# Altium footprint library RODION.PcbLib: 131 footprints (part 7 of 9)
Each footprint in its own frame and in the unit in brackets; x right, y up, seen from the top. Pads: shape width x height; smd on the part's side, far side on the other; paste and mask are expansions set on the pad; w line width, h text height; cw(c..) or ccw(c..) is an arc to the next point about the centre after c.
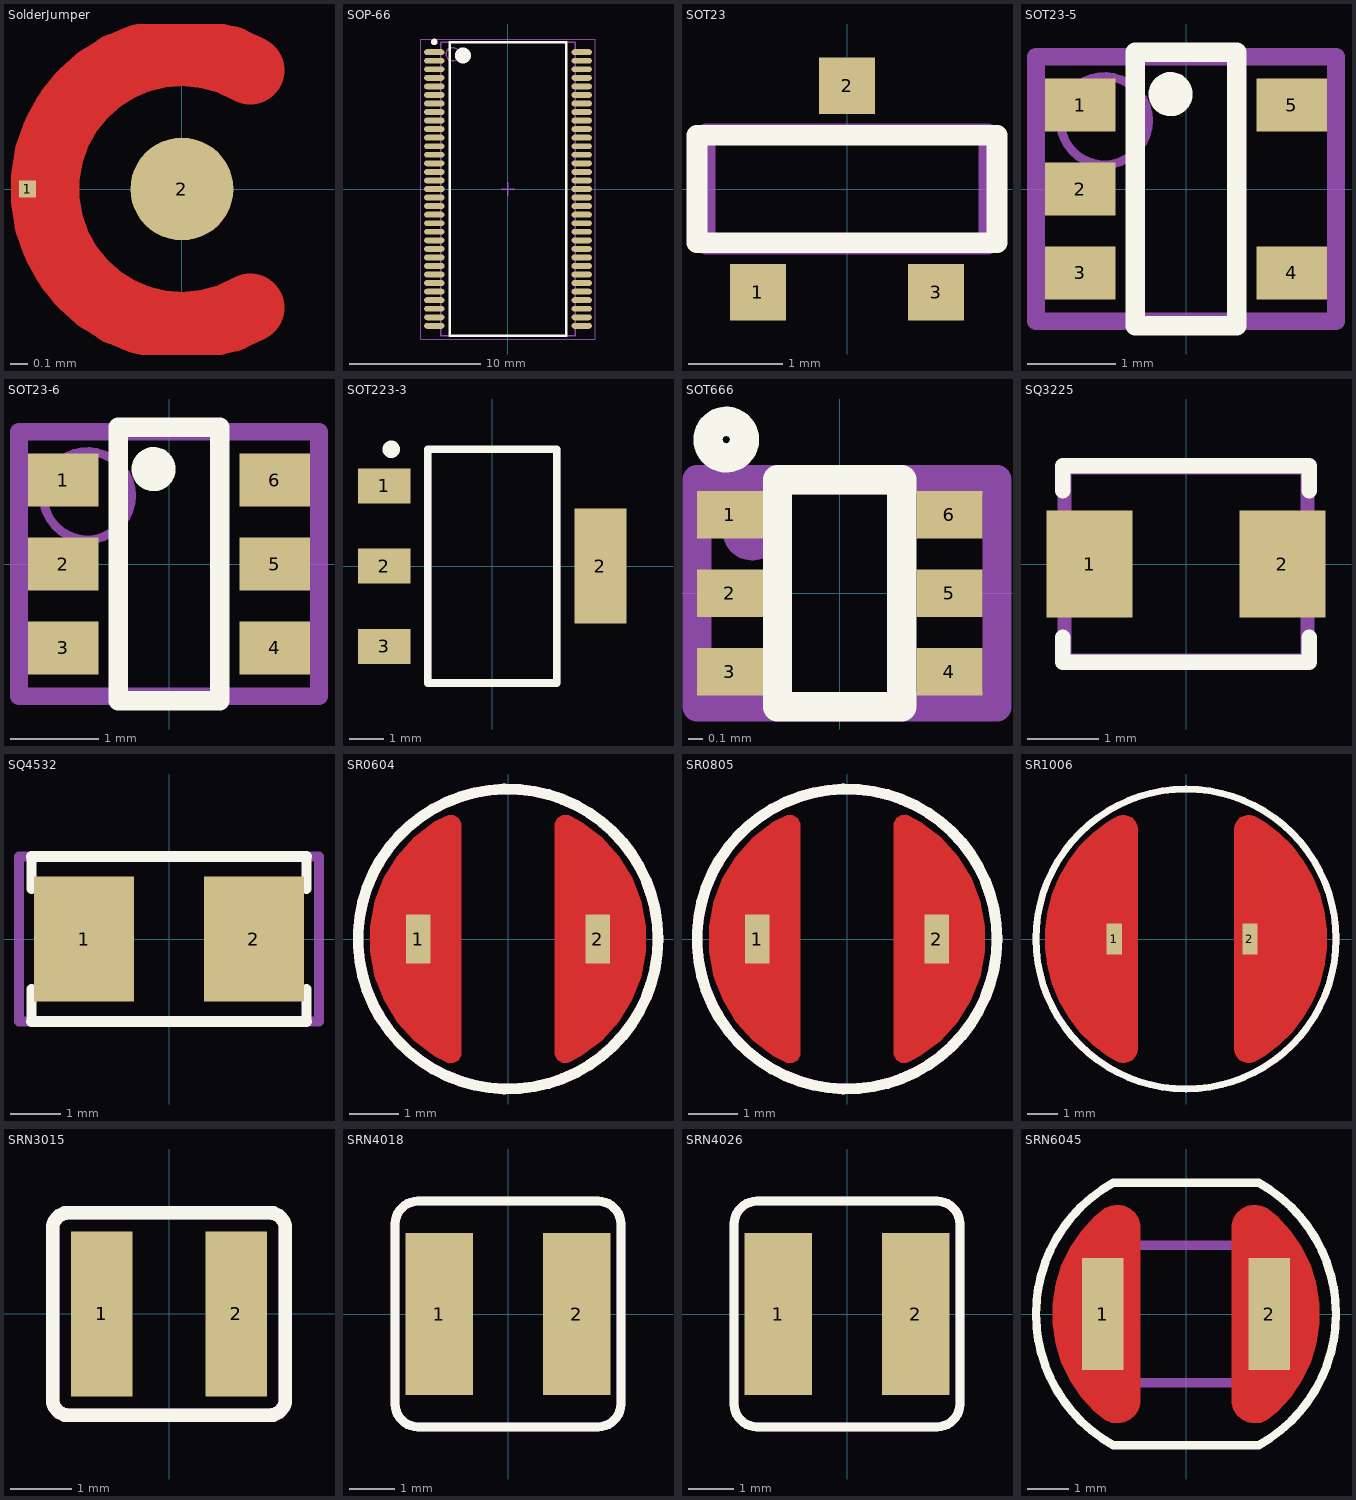
[diagram p6: the footprints below, top view; thin cyan lines are the x and y axes]

## SolderJumper [mm] "Digital"
pads (2):
  rect 0.1x0.1 smd mask+0.05: 1(-0.9,0)
  round 0.6 smd mask+0.2: 2(0,0)
Top Layer:
  lines w0.4: 0.4,-0.693 cw(c0,0) 0.4,0.693
Top_Assy:
  text ".Designator" at -0.6,-0.2 h1

## SOP-66 [mm] "SOP, 66-Leads, Body 22.22x10.16mm, Pitch 0.65mm, , IPC Medium Density"
height 1.2
pads (66):
  oval 1.55x0.45 smd: 1(-5.6,10.4) 2(-5.6,9.75) 3(-5.6,9.1) 4(-5.6,8.45) 5(-5.6,7.8) 6(-5.6,7.15) 7(-5.6,6.5) 8(-5.6,5.85) 9(-5.6,5.2) 10(-5.6,4.55) 11(-5.6,3.9) 12(-5.6,3.25) 13(-5.6,2.6) 14(-5.6,1.95) 15(-5.6,1.3) 16(-5.6,0.65) 17(-5.6,0) 18(-5.6,-0.65) 19(-5.6,-1.3) 20(-5.6,-1.95) 21(-5.6,-2.6) 22(-5.6,-3.25) 23(-5.6,-3.9) 24(-5.6,-4.55) 25(-5.6,-5.2) 26(-5.6,-5.85) 27(-5.6,-6.5) 28(-5.6,-7.15) 29(-5.6,-7.8) 30(-5.6,-8.45) 31(-5.6,-9.1) 32(-5.6,-9.75) 33(-5.6,-10.4) 34(5.6,-10.4) 35(5.6,-9.75) 36(5.6,-9.1) 37(5.6,-8.45) 38(5.6,-7.8) 39(5.6,-7.15) 40(5.6,-6.5) 41(5.6,-5.85) 42(5.6,-5.2) 43(5.6,-4.55) 44(5.6,-3.9) 45(5.6,-3.25) 46(5.6,-2.6) 47(5.6,-1.95) 48(5.6,-1.3) 49(5.6,-0.65) 50(5.6,0) 51(5.6,0.65) 52(5.6,1.3) 53(5.6,1.95) 54(5.6,2.6) 55(5.6,3.25) 56(5.6,3.9) 57(5.6,4.55) 58(5.6,5.2) 59(5.6,5.85) 60(5.6,6.5) 61(5.6,7.15) 62(5.6,7.8) 63(5.6,8.45) 64(5.6,9.1) 65(5.6,9.75) 66(5.6,10.4)
Top Overlay:
  circle w0.6: c-3.425,10.15 r0.3
  circle w0.25: c-5.6,11.175 r0.125
  lines w0.2: -4.425,-11.15 4.425,-11.15 4.425,11.15 -4.425,11.15 -4.425,-11.15
Top_Assy:
  circle w0.1: c-4.2,10.25 r0.5
  lines w0.1: -5.1,-11.15 5.1,-11.15 5.1,11.15 -5.1,11.15 -5.1,-11.15
Mechanical 15:
  lines w0.05: -6.625,-11.4 6.625,-11.4 6.625,11.4 -6.625,11.4 -6.625,-11.4
  lines w0.1: -0.5,0 0.5,0 ; 0,-0.5 0,0.5
3D body "TSOP 2-66.step": height 1.2, standoff 0, extent -5.88,-11.11 5.88,11.11

## SOT23 [mm] "SOT23, 3-Leads, Body 2.9x1.3mm, Pitch 0.95mm, Lead Span 2.3mm - Reverse Pinning, IPC Medium Density"
height 1.1
pads (3):
  rect 0.6x0.6 smd: 1(-0.95,-1.1) 2(0,1.1) 3(0.95,-1.1)
Top Overlay:
  lines w0.22: -1.6,-0.575 -1.6,0.575 1.6,0.575 1.6,-0.575 -1.6,-0.575
Top_Assy:
  lines w0.2: -1.5,-0.6 1.5,-0.6 1.5,0.6 -1.5,0.6 -1.5,-0.6
  text ".Designator" at -1.85,-0.25 h1
3D body "SW3dPS-3-lead sot23-3.STEP": height 1.01, standoff -0.01, extent -1.46,-1.25 1.46,1.226

## SOT23-5 [mm] "SOT23, 5-Leads, Body 2.9x1.6mm, Pitch 0.95mm, Lead Span 2.7mm, IPC Medium Density"
height 1.45
pads (5):
  rect 0.8x0.6 smd: 1(-1.2,0.95) 2(-1.2,0) 3(-1.2,-0.95) 4(1.2,-0.95) 5(1.2,0.95)
Top Overlay:
  circle w0.25: c-0.175,1.075 r0.125
  lines w0.22: -0.575,-1.55 0.575,-1.55 0.575,1.55 -0.575,1.55 -0.575,-1.55
Top_Assy:
  circle w0.1: c-0.925,0.775 r0.5
  lines w0.2: -1.7,-1.5 -1.7,1.5 1.7,1.5 1.7,-1.5 -1.7,-1.5
  text ".Designator" at -1.3,-1.075 h1
3D body "User Library-SOT23-5-2.step": height 1.45, standoff 0, extent -1.4,-1.45 1.4,1.45

## SOT23-6 [mm] "SOT23, 6-Leads, Body 2.9x1.6mm, Pitch 0.95mm, Lead Span 2.7mm, IPC Medium Density"
height 1.45
pads (6):
  rect 0.8x0.6 smd: 1(-1.2,0.95) 2(-1.2,0) 3(-1.2,-0.95) 4(1.2,-0.95) 5(1.2,0) 6(1.2,0.95)
Top Overlay:
  circle w0.25: c-0.175,1.075 r0.125
  lines w0.22: -0.575,-1.55 0.575,-1.55 0.575,1.55 -0.575,1.55 -0.575,-1.55
Top_Assy:
  circle w0.1: c-0.925,0.775 r0.5
  lines w0.2: -1.7,-1.5 -1.7,1.5 1.7,1.5 1.7,-1.5 -1.7,-1.5
  text ".Designator" at -1.3,-1.075 h1
3D body "User Library-SOT23-6-2.STEP": height 1.45, standoff 0, extent -1.4,-1.45 1.4,1.45

## SOT223-3 [mm] "SOT223, 4-Leads, Body 6.5x3.5mm, Pitch 2.3mm, Lead Span 7mm, IPC Medium Density"
height 1.7
pads (4):
  rect 1.5x1 smd: 1(-3.1,2.3) 2(-3.1,0) 3(-3.1,-2.3)
  rect 1.5x3.3 smd: 2(3.1,0)
Top Overlay:
  circle w0.25: c-2.9,3.35 r0.125
  lines w0.22: -1.85,-3.35 1.85,-3.35 1.85,3.35 -1.85,3.35 -1.85,-3.35
Top_Assy:
  lines w0.2: -1.85,-3.35 1.85,-3.35 1.85,3.35 -1.85,3.35 -1.85,-3.35
  text ".Designator" at -1.675,0.025 h1
3D body "SOT223-3.STEP": height 1.7, standoff 0, extent -3.5,-3.25 3.5,3.25

## SOT666 [mm] "SOT666, 6-Leads, Body 1.6x1.6mm, Pitch 0.5mm"
height 0.55
pads (6):
  rect 0.45x0.325 smd: 1(-0.75,0.537) 2(-0.75,0) 3(-0.75,-0.537) 4(0.75,-0.537) 5(0.75,0) 6(0.75,0.537)
Top Overlay:
  circle w0.2: c-0.775,1.05 r0.125
  lines w0.2: -0.425,-0.775 0.425,-0.775 0.425,0.775 -0.425,0.775 -0.425,-0.775
Top_Assy:
  circle w0.2: c-0.6,0.425 r0.1
  lines w0.2: -0.975,-0.775 -0.975,0.775 1.075,0.775 1.075,-0.775 -0.975,-0.775
  text ".Designator" at -0.55,-0.5 h1
3D body "SOT666.step": height 0.6, standoff 0, extent -0.8,-0.795 0.8,0.795

## SQ3225 [mm] "Chip Inductor, Body o7.5mm"
height 4
pads (2):
  rect 1.2x1.5 smd: 1(-1.35,0) 2(1.35,0)
Top Overlay:
  lines w0.22: -1.725,-1.375 -1.725,-1.025 ; -1.725,1.025 -1.725,1.375 1.7,1.375 ; -1.7,-1.375 1.725,-1.375 1.725,-1.025 ; 1.725,1.025 1.725,1.375
Top_Assy:
  lines w0.2: -1.7,-1.35 -1.7,1.35 1.7,1.35 1.7,-1.35 -1.7,-1.35
  text ".Designator" at -1.825,-0.125 h1
3D body "SQ3225.STEP": height 2, standoff 0, extent -1.6,-1.25 1.6,1.25

## SQ4532 [mm] "Chip Inductor, Body o3.2mm"
height 2.6
pads (2):
  rect 2x2.5 smd: 1(-1.7,0) 2(1.7,0)
Top Overlay:
  lines w0.2: -2.75,-1.65 -2.75,-1 ; -2.75,1 -2.75,1.65 ; 2.75,-1.65 2.75,-1 ; 2.75,1 2.75,1.65
  lines w0.22: -2.75,-1.65 2.75,-1.65 ; -2.75,1.65 2.75,1.65
Top_Assy:
  lines w0.2: -3,-1.65 -3,1.65 3,1.65 3,-1.65 -3,-1.65
  text ".Designator" at -2.025,0.2 h1
3D body "SQ4532.STEP": height 2.6, standoff 0, extent -2.3,-1.6 2.3,1.6

## SR0604 [mm] "Chip Inductor, Body o5.6mm"
height 4.5
pads (2):
  rect 0.5x1 smd: 1(-1.825,0) 2(1.825,0)
Top Layer:
  region: 0.948,2.297 0.948,-2.301 0.948,-2.357 1.004,-2.456 1.1,-2.515 1.213,-2.52 1.263,-2.495 1.493,-2.379 1.903,-2.067 2.249,-1.685 2.519,-1.246 2.705,-0.766 2.8,-0.26 2.801,0.255 2.708,0.762 2.523,1.243 2.254,1.682 1.91,2.065 1.501,2.379 1.271,2.495 1.219,2.521 1.104,2.517 1.005,2.456 0.948,2.355
  region: -0.949,-2.307 -0.949,2.302 -0.949,2.358 -1.005,2.457 -1.101,2.516 -1.214,2.521 -1.264,2.495 -1.495,2.379 -1.905,2.066 -2.252,1.684 -2.522,1.244 -2.707,0.763 -2.802,0.255 -2.801,-0.261 -2.707,-0.768 -2.521,-1.25 -2.25,-1.689 -1.903,-2.071 -1.492,-2.384 -1.262,-2.5 -1.212,-2.525 -1.1,-2.52 -1.004,-2.461 -0.949,-2.363
Top Overlay:
  circle w0.22: c0,0 r3.05
Top_Assy:
  circle w0.22: c0,0 r3.05
  text ".Designator" at -2.5,-0.225 h1
3D body "User Library-SR0604Cu.step": height 4.5, standoff 0, extent -2.764,-2.8 2.764,2.8

## SR0805 [mm] "Chip Inductor, Body o5.6mm"
height 4.5
pads (2):
  rect 0.5x1 smd: 1(-1.825,0) 2(1.825,0)
Top Layer:
  region: 0.948,2.297 0.948,-2.301 0.948,-2.357 1.004,-2.456 1.1,-2.515 1.213,-2.52 1.263,-2.495 1.493,-2.379 1.903,-2.067 2.249,-1.685 2.519,-1.246 2.705,-0.766 2.8,-0.26 2.801,0.255 2.708,0.762 2.523,1.243 2.254,1.682 1.91,2.065 1.501,2.379 1.271,2.495 1.219,2.521 1.104,2.517 1.005,2.456 0.948,2.355
  region: -0.949,-2.307 -0.949,2.302 -0.949,2.358 -1.005,2.457 -1.101,2.516 -1.214,2.521 -1.264,2.495 -1.495,2.379 -1.905,2.066 -2.252,1.684 -2.522,1.244 -2.707,0.763 -2.802,0.255 -2.801,-0.261 -2.707,-0.768 -2.521,-1.25 -2.25,-1.689 -1.903,-2.071 -1.492,-2.384 -1.262,-2.5 -1.212,-2.525 -1.1,-2.52 -1.004,-2.461 -0.949,-2.363
Top Overlay:
  circle w0.22: c0,0 r3.05
Top_Assy:
  circle w0.22: c0,0 r3.05
  text ".Designator" at -3,-0.15 h1
3D body "User Library-SR0604Cu.step": height 4.5, standoff 0, extent -2.764,-2.8 2.764,2.8

## SR1006 [mm] "Chip Inductor, Body o9.5mm"
height 5.5
pads (2):
  rect 0.5x1 smd: 1(-2.339,0) 2(2.088,0)
Top Layer:
  region: -2.297,-3.985 -2.559,-3.835 -3.038,-3.468 -3.464,-3.041 -3.832,-2.563 -4.134,-2.04 -4.365,-1.483 -4.521,-0.9 -4.6,-0.302 -4.6,0.302 -4.521,0.9 -4.365,1.483 -4.134,2.04 -3.832,2.563 -3.464,3.041 -3.038,3.468 -2.559,3.835 -2.297,3.985 -2.242,4.017 -2.119,4.05 -1.992,4.05 -1.87,4.017 -1.76,3.953 -1.67,3.863 -1.606,3.753 -1.573,3.631 -1.573,3.567 -1.573,-3.567 -1.573,-3.631 -1.606,-3.753 -1.67,-3.863 -1.76,-3.953 -1.87,-4.017 -1.992,-4.05 -2.119,-4.05 -2.242,-4.017
  region: 2.297,-3.985 2.559,-3.835 3.038,-3.468 3.464,-3.041 3.832,-2.563 4.134,-2.04 4.365,-1.483 4.521,-0.9 4.6,-0.302 4.6,0.302 4.521,0.9 4.365,1.483 4.134,2.04 3.832,2.563 3.464,3.041 3.038,3.468 2.559,3.835 2.297,3.985 2.242,4.017 2.119,4.05 1.992,4.05 1.87,4.017 1.76,3.953 1.67,3.863 1.606,3.753 1.573,3.631 1.573,3.567 1.573,-3.567 1.573,-3.631 1.606,-3.753 1.67,-3.863 1.76,-3.953 1.87,-4.017 1.992,-4.05 2.119,-4.05 2.242,-4.017
Top Overlay:
  circle w0.22: c0,0 r4.9
Top_Assy:
  circle w0.22: c0,0 r4.9
  text ".Designator" at -2.425,-0.1 h1
3D body "SR1006.step": height 5.51, standoff 0, extent -4.75,-4.75 4.75,4.75

## SRN3015 [mm] "Chip Inductor, Body 3mm"
height 1.5
pads (2):
  rect 1x2.7 smd: 1(-1.1,0) 2(1.1,0)
Top Overlay:
  lines w0.22: -1.7,-1.65 1.7,-1.65 ; -1.7,1.65 1.7,1.65 ; -1.65,-1.65 cw(c-1.65,-1.4) -1.9,-1.4 -1.9,1.4 cw(c-1.65,1.4) -1.65,1.65 ; 1.65,-1.65 ccw(c1.65,-1.4) 1.9,-1.4 1.9,1.4 ccw(c1.65,1.4) 1.65,1.65
Top_Assy:
  lines w0.22: -1.7,-1.65 1.7,-1.65 ; -1.7,1.65 1.7,1.65 ; -1.65,-1.65 cw(c-1.65,-1.4) -1.9,-1.4 -1.9,1.4 cw(c-1.65,1.4) -1.65,1.65 ; 1.65,-1.65 ccw(c1.65,-1.4) 1.9,-1.4 1.9,1.4 ccw(c1.65,1.4) 1.65,1.65
  text ".Designator" at -1.5,-0.4 h1
3D body "SRN3015.step": height 1.5, standoff 0, extent -1.51,-1.362 1.51,1.362

## SRN4018 [mm] "Chip Inductor, Body 4mm"
height 1.8
pads (2):
  rect 1.5x3.6 smd: 1(-1.525,0) 2(1.525,0)
Top Overlay:
  lines w0.2: -2.5,-2 ccw(c-2,-2) -2,-2.5 2,-2.5 ccw(c2,-2) 2.5,-2 2.5,2 ccw(c2,2) 2,2.5 -2,2.5 ccw(c-2,2) -2.5,2 -2.5,-2
Top_Assy:
  lines w0.2: -2.5,-2 ccw(c-2,-2) -2,-2.5 2,-2.5 ccw(c2,-2) 2.5,-2 2.5,2 ccw(c2,2) 2,2.5 -2,2.5 ccw(c-2,2) -2.5,2 -2.5,-2
  text ".Designator" at -1.5,-0.4 h1
3D body "SRN4018.stp": height 1.8, standoff 0, extent -2,-2.05 2,2.05

## SRN4026 [mm] "Chip Inductor, Body 4mm"
height 2.5
pads (2):
  rect 1.5x3.6 smd: 1(-1.525,0) 2(1.525,0)
Top Overlay:
  lines w0.2: -2.5,-2 ccw(c-2,-2) -2,-2.5 2,-2.5 ccw(c2,-2) 2.5,-2 2.5,2 ccw(c2,2) 2,2.5 -2,2.5 ccw(c-2,2) -2.5,2 -2.5,-2
Top_Assy:
  lines w0.2: -2.5,-2 ccw(c-2,-2) -2,-2.5 2,-2.5 ccw(c2,-2) 2.5,-2 2.5,2 ccw(c2,2) 2,2.5 -2,2.5 ccw(c-2,2) -2.5,2 -2.5,-2
  text ".Designator" at -1.5,-0.4 h1
3D body "SRN4026.stp": height 2.5, standoff 0, extent -2,-2.05 2,2.05

## SRN6045 [mm] "Chip Inductor, Body 6mm"
height 4.2
pads (2):
  rect 1x2.7 smd: 1(-2,0) 2(2,0)
Top Layer:
  region: 2.006,-2.493 2.192,-2.344 2.515,-1.993 2.783,-1.598 2.989,-1.167 3.129,-0.711 3.2,-0.239 3.2,0.238 3.129,0.71 2.989,1.166 2.783,1.597 2.516,1.992 2.193,2.343 2.007,2.493 1.945,2.542 1.799,2.604 1.641,2.622 1.485,2.596 1.341,2.527 1.223,2.422 1.138,2.288 1.094,2.135 1.094,2.056 1.094,-2.057 1.094,-2.136 1.138,-2.288 1.223,-2.422 1.341,-2.528 1.484,-2.596 1.64,-2.622 1.798,-2.604 1.944,-2.543
  region: -2.006,-2.493 -2.192,-2.344 -2.515,-1.993 -2.783,-1.598 -2.989,-1.167 -3.129,-0.711 -3.2,-0.239 -3.2,0.238 -3.129,0.71 -2.989,1.166 -2.783,1.597 -2.516,1.992 -2.193,2.343 -2.007,2.493 -1.945,2.542 -1.799,2.604 -1.641,2.622 -1.485,2.596 -1.341,2.527 -1.223,2.422 -1.138,2.288 -1.094,2.135 -1.094,2.056 -1.094,-2.057 -1.094,-2.136 -1.138,-2.288 -1.223,-2.422 -1.341,-2.528 -1.484,-2.596 -1.64,-2.622 -1.798,-2.604 -1.944,-2.543
Top Overlay:
  lines w0.2: -1.745,-3.149 cw(c0,0) -1.745,3.149 1.745,3.149 cw(c0,0) 1.745,-3.149 -1.745,-3.149
Top_Assy:
  lines w0.22: -1.7,-1.65 1.7,-1.65 ; -1.7,1.65 1.7,1.65 ; -1.65,-1.65 cw(c-1.65,-1.4) -1.9,-1.4 -1.9,1.4 cw(c-1.65,1.4) -1.65,1.65 ; 1.65,-1.65 ccw(c1.65,-1.4) 1.9,-1.4 1.9,1.4 ccw(c1.65,1.4) 1.65,1.65
  text ".Designator" at -1.5,-0.4 h1
3D body "SRN6045.step": height 4.5, standoff 0, extent -3.15,-3 3.15,3